# Altium integrated library Weidmueller_OMNIMATE_Power.IntLib: 508 symbols (part 9 of 9)
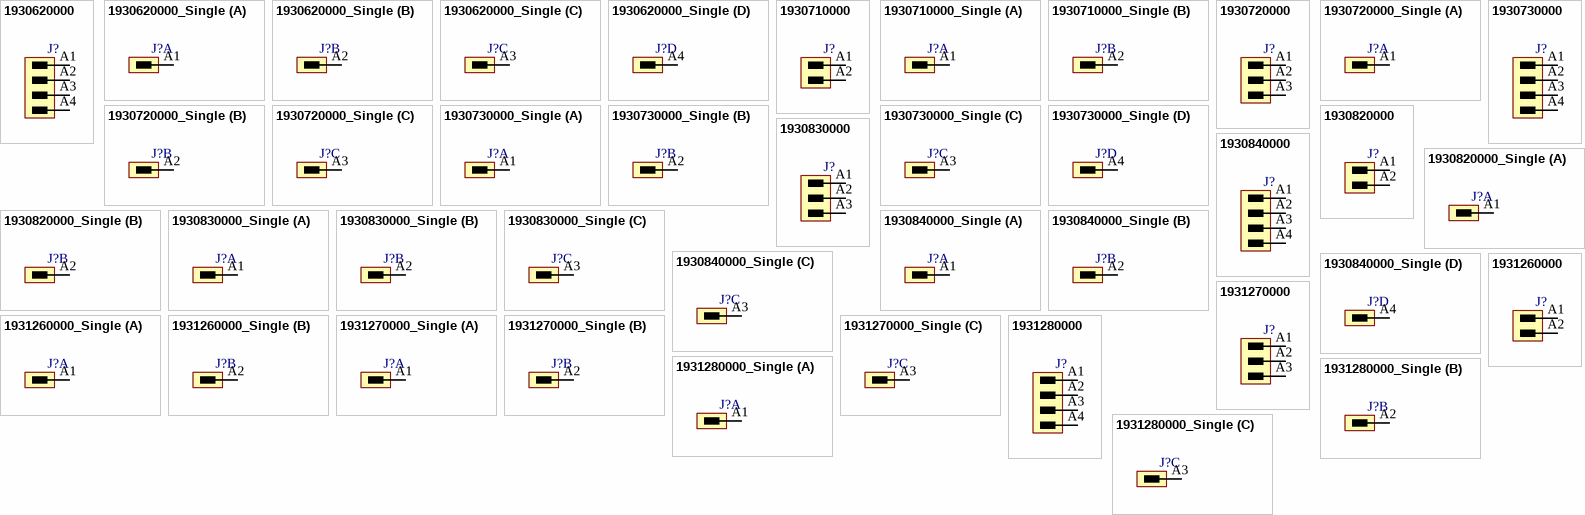
[diagram p39: symbols 1930620000 to 1931280000_Single]

## 1931260000_Single
designator J?
OMNIMATE Power - series BV/SV 7.62HP; PartNumber: 1931260000; Manufacturer: Weidmueller; Short_text_for_material: SV 7.62HP/02/270G 3.5SN BK BX; Side_termination_characteristic: closed side; Mounting_onto_the_PCB: Solder connection; Pitch_mm: 7.62 mm; Pitch_inch: 0.3 inch; No_of_poles: 2; Outgoing_elbow: 270°; Solder_pin_length_mm: 3.5 mm; Contact_material: Cu-Leg; Contact_surface: tinned; Insulating_material: PA GF; UL_94_flammability_rating: V-0; Rated_voltage_for_surge_voltage_class_pollution_degree_II_2: 1000 V; Rated_voltage_use_group_B_UL_1059: 300 V; Rated_current_use_group_B_UL_1059: 40.5 A; PackageReference: SV_7_62HP_270G_02; Colour: Black; Packaging: Box; Qty: 120 PCS; Revision: V1; ComponentLink1Description: Manufacturer URL; ComponentLink1URL: http://www.weidmueller.com/; ComponentLink2Description: URL Link1; ComponentLink2URL: http://catalog.weidmueller.com/catalog/Start.do?localeId=en&ObjectID=1931260000
footprint SV_7_62HP_270G_02 (OMNIMATE Power - Serie BV/SV 7.62HP  SV 7.62HP/02/270G 3.5)
part A pins: A1
part B pins: A2

## 1931270000
designator J?
OMNIMATE Power - series BV/SV 7.62HP; PartNumber: 1931270000; Manufacturer: Weidmueller; Short_text_for_material: SV 7.62HP/03/270G 3.5SN BK BX; Side_termination_characteristic: closed side; Mounting_onto_the_PCB: Solder connection; Pitch_mm: 7.62 mm; Pitch_inch: 0.3 inch; No_of_poles: 3; Outgoing_elbow: 270°; Solder_pin_length_mm: 3.5 mm; Contact_material: Cu-Leg; Contact_surface: tinned; Insulating_material: PA GF; UL_94_flammability_rating: V-0; Rated_voltage_for_surge_voltage_class_pollution_degree_II_2: 1000 V; Rated_voltage_use_group_B_UL_1059: 300 V; Rated_current_use_group_B_UL_1059: 40.5 A; PackageReference: SV_7_62HP_270G_03; Colour: Black; Packaging: Box; Qty: 78 PCS; Revision: V1; ComponentLink1Description: Manufacturer URL; ComponentLink1URL: http://www.weidmueller.com/; ComponentLink2Description: URL Link1; ComponentLink2URL: http://catalog.weidmueller.com/catalog/Start.do?localeId=en&ObjectID=1931270000
footprint SV_7_62HP_270G_03 (OMNIMATE Power - Serie BV/SV 7.62HP  SV 7.62HP/03/270G 3.5)
pins: A1, A2, A3

## 1931270000_Single
designator J?
OMNIMATE Power - series BV/SV 7.62HP; PartNumber: 1931270000; Manufacturer: Weidmueller; Short_text_for_material: SV 7.62HP/03/270G 3.5SN BK BX; Side_termination_characteristic: closed side; Mounting_onto_the_PCB: Solder connection; Pitch_mm: 7.62 mm; Pitch_inch: 0.3 inch; No_of_poles: 3; Outgoing_elbow: 270°; Solder_pin_length_mm: 3.5 mm; Contact_material: Cu-Leg; Contact_surface: tinned; Insulating_material: PA GF; UL_94_flammability_rating: V-0; Rated_voltage_for_surge_voltage_class_pollution_degree_II_2: 1000 V; Rated_voltage_use_group_B_UL_1059: 300 V; Rated_current_use_group_B_UL_1059: 40.5 A; PackageReference: SV_7_62HP_270G_03; Colour: Black; Packaging: Box; Qty: 78 PCS; Revision: V1; ComponentLink1Description: Manufacturer URL; ComponentLink1URL: http://www.weidmueller.com/; ComponentLink2Description: URL Link1; ComponentLink2URL: http://catalog.weidmueller.com/catalog/Start.do?localeId=en&ObjectID=1931270000
footprint SV_7_62HP_270G_03 (OMNIMATE Power - Serie BV/SV 7.62HP  SV 7.62HP/03/270G 3.5)
part A pins: A1
part B pins: A2
part C pins: A3

## 1931280000
designator J?
OMNIMATE Power - series BV/SV 7.62HP; PartNumber: 1931280000; Manufacturer: Weidmueller; Short_text_for_material: SV 7.62HP/04/270G 3.5SN BK BX; Side_termination_characteristic: closed side; Mounting_onto_the_PCB: Solder connection; Pitch_mm: 7.62 mm; Pitch_inch: 0.3 inch; No_of_poles: 4; Outgoing_elbow: 270°; Solder_pin_length_mm: 3.5 mm; Contact_material: Cu-Leg; Contact_surface: tinned; Insulating_material: PA GF; UL_94_flammability_rating: V-0; Rated_voltage_for_surge_voltage_class_pollution_degree_II_2: 1000 V; Rated_voltage_use_group_B_UL_1059: 300 V; Rated_current_use_group_B_UL_1059: 40.5 A; PackageReference: SV_7_62HP_270G_04; Colour: Black; Packaging: Box; Qty: 60 PCS; Revision: V1; ComponentLink1Description: Manufacturer URL; ComponentLink1URL: http://www.weidmueller.com/; ComponentLink2Description: URL Link1; ComponentLink2URL: http://catalog.weidmueller.com/catalog/Start.do?localeId=en&ObjectID=1931280000
footprint SV_7_62HP_270G_04 (OMNIMATE Power - Serie BV/SV 7.62HP  SV 7.62HP/04/270G 3.5)
pins: A1, A2, A3, A4

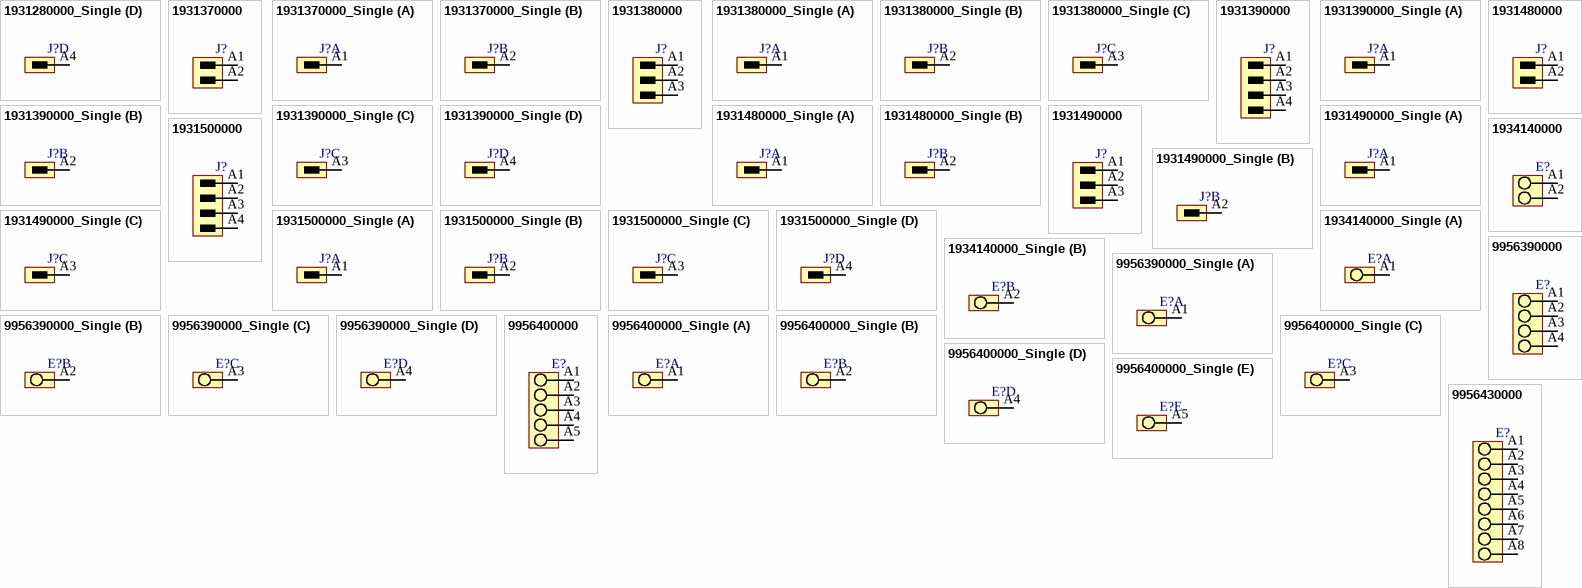
[diagram p30: symbols 1931280000_Single to 9956430000]

## 1931280000_Single
designator J?
OMNIMATE Power - series BV/SV 7.62HP; PartNumber: 1931280000; Manufacturer: Weidmueller; Short_text_for_material: SV 7.62HP/04/270G 3.5SN BK BX; Side_termination_characteristic: closed side; Mounting_onto_the_PCB: Solder connection; Pitch_mm: 7.62 mm; Pitch_inch: 0.3 inch; No_of_poles: 4; Outgoing_elbow: 270°; Solder_pin_length_mm: 3.5 mm; Contact_material: Cu-Leg; Contact_surface: tinned; Insulating_material: PA GF; UL_94_flammability_rating: V-0; Rated_voltage_for_surge_voltage_class_pollution_degree_II_2: 1000 V; Rated_voltage_use_group_B_UL_1059: 300 V; Rated_current_use_group_B_UL_1059: 40.5 A; PackageReference: SV_7_62HP_270G_04; Colour: Black; Packaging: Box; Qty: 60 PCS; Revision: V1; ComponentLink1Description: Manufacturer URL; ComponentLink1URL: http://www.weidmueller.com/; ComponentLink2Description: URL Link1; ComponentLink2URL: http://catalog.weidmueller.com/catalog/Start.do?localeId=en&ObjectID=1931280000
footprint SV_7_62HP_270G_04 (OMNIMATE Power - Serie BV/SV 7.62HP  SV 7.62HP/04/270G 3.5)
part A pins: A1
part B pins: A2
part C pins: A3
part D pins: A4

## 1931370000
designator J?
OMNIMATE Power - series BV/SV 7.62HP; PartNumber: 1931370000; Manufacturer: Weidmueller; Short_text_for_material: SV 7.62HP/02/270F 3.5SN BK BX; Side_termination_characteristic: Clip-on flange; Mounting_onto_the_PCB: Solder connection; Pitch_mm: 7.62 mm; Pitch_inch: 0.3 inch; No_of_poles: 2; Outgoing_elbow: 270°; Solder_pin_length_mm: 3.5 mm; Contact_material: Cu-Leg; Contact_surface: tinned; Insulating_material: PA GF; UL_94_flammability_rating: V-0; Rated_voltage_for_surge_voltage_class_pollution_degree_II_2: 1000 V; Rated_voltage_use_group_B_UL_1059: 300 V; Rated_current_use_group_B_UL_1059: 40.5 A; PackageReference: SV_7_62HP_270F_02; Colour: Black; Packaging: Box; Qty: 60 PCS; Revision: V1; ComponentLink1Description: Manufacturer URL; ComponentLink1URL: http://www.weidmueller.com/; ComponentLink2Description: URL Link1; ComponentLink2URL: http://catalog.weidmueller.com/catalog/Start.do?localeId=en&ObjectID=1931370000
footprint SV_7_62HP_270F_02 (OMNIMATE Power - Serie BV/SV 7.62HP  SV 7.62HP/02/270F 3.5)
pins: A1, A2

## 1931370000_Single
designator J?
OMNIMATE Power - series BV/SV 7.62HP; PartNumber: 1931370000; Manufacturer: Weidmueller; Short_text_for_material: SV 7.62HP/02/270F 3.5SN BK BX; Side_termination_characteristic: Clip-on flange; Mounting_onto_the_PCB: Solder connection; Pitch_mm: 7.62 mm; Pitch_inch: 0.3 inch; No_of_poles: 2; Outgoing_elbow: 270°; Solder_pin_length_mm: 3.5 mm; Contact_material: Cu-Leg; Contact_surface: tinned; Insulating_material: PA GF; UL_94_flammability_rating: V-0; Rated_voltage_for_surge_voltage_class_pollution_degree_II_2: 1000 V; Rated_voltage_use_group_B_UL_1059: 300 V; Rated_current_use_group_B_UL_1059: 40.5 A; PackageReference: SV_7_62HP_270F_02; Colour: Black; Packaging: Box; Qty: 60 PCS; Revision: V1; ComponentLink1Description: Manufacturer URL; ComponentLink1URL: http://www.weidmueller.com/; ComponentLink2Description: URL Link1; ComponentLink2URL: http://catalog.weidmueller.com/catalog/Start.do?localeId=en&ObjectID=1931370000
footprint SV_7_62HP_270F_02 (OMNIMATE Power - Serie BV/SV 7.62HP  SV 7.62HP/02/270F 3.5)
part A pins: A1
part B pins: A2

## 1931380000
designator J?
OMNIMATE Power - series BV/SV 7.62HP; PartNumber: 1931380000; Manufacturer: Weidmueller; Short_text_for_material: SV 7.62HP/03/270F 3.5SN BK BX; Side_termination_characteristic: Clip-on flange; Mounting_onto_the_PCB: Solder connection; Pitch_mm: 7.62 mm; Pitch_inch: 0.3 inch; No_of_poles: 3; Outgoing_elbow: 270°; Solder_pin_length_mm: 3.5 mm; Contact_material: Cu-Leg; Contact_surface: tinned; Insulating_material: PA GF; UL_94_flammability_rating: V-0; Rated_voltage_for_surge_voltage_class_pollution_degree_II_2: 1000 V; Rated_voltage_use_group_B_UL_1059: 300 V; Rated_current_use_group_B_UL_1059: 40.5 A; PackageReference: SV_7_62HP_270F_03; Colour: Black; Packaging: Box; Qty: 48 PCS; Revision: V1; ComponentLink1Description: Manufacturer URL; ComponentLink1URL: http://www.weidmueller.com/; ComponentLink2Description: URL Link1; ComponentLink2URL: http://catalog.weidmueller.com/catalog/Start.do?localeId=en&ObjectID=1931380000
footprint SV_7_62HP_270F_03 (OMNIMATE Power - Serie BV/SV 7.62HP  SV 7.62HP/03/270F 3.5)
pins: A1, A2, A3

## 1931380000_Single
designator J?
OMNIMATE Power - series BV/SV 7.62HP; PartNumber: 1931380000; Manufacturer: Weidmueller; Short_text_for_material: SV 7.62HP/03/270F 3.5SN BK BX; Side_termination_characteristic: Clip-on flange; Mounting_onto_the_PCB: Solder connection; Pitch_mm: 7.62 mm; Pitch_inch: 0.3 inch; No_of_poles: 3; Outgoing_elbow: 270°; Solder_pin_length_mm: 3.5 mm; Contact_material: Cu-Leg; Contact_surface: tinned; Insulating_material: PA GF; UL_94_flammability_rating: V-0; Rated_voltage_for_surge_voltage_class_pollution_degree_II_2: 1000 V; Rated_voltage_use_group_B_UL_1059: 300 V; Rated_current_use_group_B_UL_1059: 40.5 A; PackageReference: SV_7_62HP_270F_03; Colour: Black; Packaging: Box; Qty: 48 PCS; Revision: V1; ComponentLink1Description: Manufacturer URL; ComponentLink1URL: http://www.weidmueller.com/; ComponentLink2Description: URL Link1; ComponentLink2URL: http://catalog.weidmueller.com/catalog/Start.do?localeId=en&ObjectID=1931380000
footprint SV_7_62HP_270F_03 (OMNIMATE Power - Serie BV/SV 7.62HP  SV 7.62HP/03/270F 3.5)
part A pins: A1
part B pins: A2
part C pins: A3

## 1931390000
designator J?
OMNIMATE Power - series BV/SV 7.62HP; PartNumber: 1931390000; Manufacturer: Weidmueller; Short_text_for_material: SV 7.62HP/04/270F 3.5SN BK BX; Side_termination_characteristic: Clip-on flange; Mounting_onto_the_PCB: Solder connection; Pitch_mm: 7.62 mm; Pitch_inch: 0.3 inch; No_of_poles: 4; Outgoing_elbow: 270°; Solder_pin_length_mm: 3.5 mm; Contact_material: Cu-Leg; Contact_surface: tinned; Insulating_material: PA GF; UL_94_flammability_rating: V-0; Rated_voltage_for_surge_voltage_class_pollution_degree_II_2: 1000 V; Rated_voltage_use_group_B_UL_1059: 300 V; Rated_current_use_group_B_UL_1059: 40.5 A; PackageReference: SV_7_62HP_270F_04; Colour: Black; Packaging: Box; Qty: 36 PCS; Revision: V1; ComponentLink1Description: Manufacturer URL; ComponentLink1URL: http://www.weidmueller.com/; ComponentLink2Description: URL Link1; ComponentLink2URL: http://catalog.weidmueller.com/catalog/Start.do?localeId=en&ObjectID=1931390000
footprint SV_7_62HP_270F_04 (OMNIMATE Power - Serie BV/SV 7.62HP  SV 7.62HP/04/270F 3.5)
pins: A1, A2, A3, A4

## 1931390000_Single
designator J?
OMNIMATE Power - series BV/SV 7.62HP; PartNumber: 1931390000; Manufacturer: Weidmueller; Short_text_for_material: SV 7.62HP/04/270F 3.5SN BK BX; Side_termination_characteristic: Clip-on flange; Mounting_onto_the_PCB: Solder connection; Pitch_mm: 7.62 mm; Pitch_inch: 0.3 inch; No_of_poles: 4; Outgoing_elbow: 270°; Solder_pin_length_mm: 3.5 mm; Contact_material: Cu-Leg; Contact_surface: tinned; Insulating_material: PA GF; UL_94_flammability_rating: V-0; Rated_voltage_for_surge_voltage_class_pollution_degree_II_2: 1000 V; Rated_voltage_use_group_B_UL_1059: 300 V; Rated_current_use_group_B_UL_1059: 40.5 A; PackageReference: SV_7_62HP_270F_04; Colour: Black; Packaging: Box; Qty: 36 PCS; Revision: V1; ComponentLink1Description: Manufacturer URL; ComponentLink1URL: http://www.weidmueller.com/; ComponentLink2Description: URL Link1; ComponentLink2URL: http://catalog.weidmueller.com/catalog/Start.do?localeId=en&ObjectID=1931390000
footprint SV_7_62HP_270F_04 (OMNIMATE Power - Serie BV/SV 7.62HP  SV 7.62HP/04/270F 3.5)
part A pins: A1
part B pins: A2
part C pins: A3
part D pins: A4

## 1931480000
designator J?
OMNIMATE Power - series BV/SV 7.62HP; PartNumber: 1931480000; Manufacturer: Weidmueller; Short_text_for_material: SV 7.62HP/02/270SF 3.5SN BK BX; Side_termination_characteristic: Screw/clip-on flange; Mounting_onto_the_PCB: Solder connection; Pitch_mm: 7.62 mm; Pitch_inch: 0.3 inch; No_of_poles: 2; Outgoing_elbow: 270°; Solder_pin_length_mm: 3.5 mm; Contact_material: Cu-Leg; Contact_surface: tinned; Insulating_material: PA GF; UL_94_flammability_rating: V-0; Rated_voltage_for_surge_voltage_class_pollution_degree_II_2: 1000 V; Rated_voltage_use_group_B_UL_1059: 300 V; Rated_current_use_group_B_UL_1059: 40.5 A; PackageReference: SV_7_62HP_270SF_02; Colour: Black; Packaging: Box; Qty: 100 PCS; Revision: V1; ComponentLink1Description: Manufacturer URL; ComponentLink1URL: http://www.weidmueller.com/; ComponentLink2Description: URL Link1; ComponentLink2URL: http://catalog.weidmueller.com/catalog/Start.do?localeId=en&ObjectID=1931480000
footprint SV_7_62HP_270SF_02 (OMNIMATE Power - Serie BV/SV 7.62HP  SV 7.62HP/02/270SF 3.5)
pins: A1, A2

## 1931480000_Single
designator J?
OMNIMATE Power - series BV/SV 7.62HP; PartNumber: 1931480000; Manufacturer: Weidmueller; Short_text_for_material: SV 7.62HP/02/270SF 3.5SN BK BX; Side_termination_characteristic: Screw/clip-on flange; Mounting_onto_the_PCB: Solder connection; Pitch_mm: 7.62 mm; Pitch_inch: 0.3 inch; No_of_poles: 2; Outgoing_elbow: 270°; Solder_pin_length_mm: 3.5 mm; Contact_material: Cu-Leg; Contact_surface: tinned; Insulating_material: PA GF; UL_94_flammability_rating: V-0; Rated_voltage_for_surge_voltage_class_pollution_degree_II_2: 1000 V; Rated_voltage_use_group_B_UL_1059: 300 V; Rated_current_use_group_B_UL_1059: 40.5 A; PackageReference: SV_7_62HP_270SF_02; Colour: Black; Packaging: Box; Qty: 100 PCS; Revision: V1; ComponentLink1Description: Manufacturer URL; ComponentLink1URL: http://www.weidmueller.com/; ComponentLink2Description: URL Link1; ComponentLink2URL: http://catalog.weidmueller.com/catalog/Start.do?localeId=en&ObjectID=1931480000
footprint SV_7_62HP_270SF_02 (OMNIMATE Power - Serie BV/SV 7.62HP  SV 7.62HP/02/270SF 3.5)
part A pins: A1
part B pins: A2

## 1931490000
designator J?
OMNIMATE Power - series BV/SV 7.62HP; PartNumber: 1931490000; Manufacturer: Weidmueller; Short_text_for_material: SV 7.62HP/03/270SF 3.5SN BK BX; Side_termination_characteristic: Screw/clip-on flange; Mounting_onto_the_PCB: Solder connection; Pitch_mm: 7.62 mm; Pitch_inch: 0.3 inch; No_of_poles: 3; Outgoing_elbow: 270°; Solder_pin_length_mm: 3.5 mm; Contact_material: Cu-Leg; Contact_surface: tinned; Insulating_material: PA GF; UL_94_flammability_rating: V-0; Rated_voltage_for_surge_voltage_class_pollution_degree_II_2: 1000 V; Rated_voltage_use_group_B_UL_1059: 300 V; Rated_current_use_group_B_UL_1059: 40.5 A; PackageReference: SV_7_62HP_270SF_03; Colour: Black; Packaging: Box; Qty: 100 PCS; Revision: V1; ComponentLink1Description: Manufacturer URL; ComponentLink1URL: http://www.weidmueller.com/; ComponentLink2Description: URL Link1; ComponentLink2URL: http://catalog.weidmueller.com/catalog/Start.do?localeId=en&ObjectID=1931490000
footprint SV_7_62HP_270SF_03 (OMNIMATE Power - Serie BV/SV 7.62HP  SV 7.62HP/03/270SF 3.5)
pins: A1, A2, A3

## 1931490000_Single
designator J?
OMNIMATE Power - series BV/SV 7.62HP; PartNumber: 1931490000; Manufacturer: Weidmueller; Short_text_for_material: SV 7.62HP/03/270SF 3.5SN BK BX; Side_termination_characteristic: Screw/clip-on flange; Mounting_onto_the_PCB: Solder connection; Pitch_mm: 7.62 mm; Pitch_inch: 0.3 inch; No_of_poles: 3; Outgoing_elbow: 270°; Solder_pin_length_mm: 3.5 mm; Contact_material: Cu-Leg; Contact_surface: tinned; Insulating_material: PA GF; UL_94_flammability_rating: V-0; Rated_voltage_for_surge_voltage_class_pollution_degree_II_2: 1000 V; Rated_voltage_use_group_B_UL_1059: 300 V; Rated_current_use_group_B_UL_1059: 40.5 A; PackageReference: SV_7_62HP_270SF_03; Colour: Black; Packaging: Box; Qty: 100 PCS; Revision: V1; ComponentLink1Description: Manufacturer URL; ComponentLink1URL: http://www.weidmueller.com/; ComponentLink2Description: URL Link1; ComponentLink2URL: http://catalog.weidmueller.com/catalog/Start.do?localeId=en&ObjectID=1931490000
footprint SV_7_62HP_270SF_03 (OMNIMATE Power - Serie BV/SV 7.62HP  SV 7.62HP/03/270SF 3.5)
part A pins: A1
part B pins: A2
part C pins: A3

## 1931500000
designator J?
OMNIMATE Power - series BV/SV 7.62HP; PartNumber: 1931500000; Manufacturer: Weidmueller; Short_text_for_material: SV 7.62HP/04/270SF 3.5SN BK BX; Side_termination_characteristic: Screw/clip-on flange; Mounting_onto_the_PCB: Solder connection; Pitch_mm: 7.62 mm; Pitch_inch: 0.3 inch; No_of_poles: 4; Outgoing_elbow: 270°; Solder_pin_length_mm: 3.5 mm; Contact_material: Cu-Leg; Contact_surface: tinned; Insulating_material: PA GF; UL_94_flammability_rating: V-0; Rated_voltage_for_surge_voltage_class_pollution_degree_II_2: 1000 V; Rated_voltage_use_group_B_UL_1059: 300 V; Rated_current_use_group_B_UL_1059: 40.5 A; PackageReference: SV_7_62HP_270SF_04; Colour: Black; Packaging: Box; Qty: 100 PCS; Revision: V1; ComponentLink1Description: Manufacturer URL; ComponentLink1URL: http://www.weidmueller.com/; ComponentLink2Description: URL Link1; ComponentLink2URL: http://catalog.weidmueller.com/catalog/Start.do?localeId=en&ObjectID=1931500000
footprint SV_7_62HP_270SF_04 (OMNIMATE Power - Serie BV/SV 7.62HP  SV 7.62HP/04/270SF 3.5)
pins: A1, A2, A3, A4

## 1931500000_Single
designator J?
OMNIMATE Power - series BV/SV 7.62HP; PartNumber: 1931500000; Manufacturer: Weidmueller; Short_text_for_material: SV 7.62HP/04/270SF 3.5SN BK BX; Side_termination_characteristic: Screw/clip-on flange; Mounting_onto_the_PCB: Solder connection; Pitch_mm: 7.62 mm; Pitch_inch: 0.3 inch; No_of_poles: 4; Outgoing_elbow: 270°; Solder_pin_length_mm: 3.5 mm; Contact_material: Cu-Leg; Contact_surface: tinned; Insulating_material: PA GF; UL_94_flammability_rating: V-0; Rated_voltage_for_surge_voltage_class_pollution_degree_II_2: 1000 V; Rated_voltage_use_group_B_UL_1059: 300 V; Rated_current_use_group_B_UL_1059: 40.5 A; PackageReference: SV_7_62HP_270SF_04; Colour: Black; Packaging: Box; Qty: 100 PCS; Revision: V1; ComponentLink1Description: Manufacturer URL; ComponentLink1URL: http://www.weidmueller.com/; ComponentLink2Description: URL Link1; ComponentLink2URL: http://catalog.weidmueller.com/catalog/Start.do?localeId=en&ObjectID=1931500000
footprint SV_7_62HP_270SF_04 (OMNIMATE Power - Serie BV/SV 7.62HP  SV 7.62HP/04/270SF 3.5)
part A pins: A1
part B pins: A2
part C pins: A3
part D pins: A4

## 1934140000
designator E?
OMNIMATE Power - series LU; PartNumber: 1934140000; Manufacturer: Weidmueller; Short_text_for_material: LU 10.16/02/90 4.5SN BK BX; Side_termination_characteristic: closed side; Mounting_onto_the_PCB: Solder connection; Pitch_mm: 10,16 mm; Pitch_inch: 0,4 inch; No_of_poles: 2; Solder_pin_length_mm: 4,5 mm; Contact_material: E-Cu; Contact_surface: tinned; Insulating_material: Wemid (PA); UL_94_flammability_rating: V-0; Rated_voltage_for_surge_voltage_class_pollution_degree_II_2: 1000 V; Solid_min_H05_07_V_U: 0,5 mm²; Solid_max_H05_07_V_U: 16 mm²; Rated_voltage_use_group_B_UL_1059: 300 V; Rated_current_use_group_B_UL_1059: 65 A; Wire_cross_section_AWG_min_UL_1059: AWG 26; Wire_cross_section_AWG_max_UL_1059: AWG 6; PackageReference: LU_10_16_90_02; Colour: Black; Packaging: Box; Qty: 20 PCS; Revision: V1; ComponentLink1Description: Manufacturer URL; ComponentLink1URL: http://www.weidmueller.com/; ComponentLink2Description: URL Link1; ComponentLink2URL: http://catalog.weidmueller.com/catalog/Start.do?localeId=en&ObjectID=1934140000
footprint LU_10_16_90_02 (OMNIMATE Power - Serie LU  LU 10.16/02/90 4.5)
pins: A1, A2
1 alternate drawing of the same symbol

## 1934140000_Single
designator E?
OMNIMATE Power - series LU; PartNumber: 1934140000; Manufacturer: Weidmueller; Short_text_for_material: LU 10.16/02/90 4.5SN BK BX; Side_termination_characteristic: closed side; Mounting_onto_the_PCB: Solder connection; Pitch_mm: 10,16 mm; Pitch_inch: 0,4 inch; No_of_poles: 2; Solder_pin_length_mm: 4,5 mm; Contact_material: E-Cu; Contact_surface: tinned; Insulating_material: Wemid (PA); UL_94_flammability_rating: V-0; Rated_voltage_for_surge_voltage_class_pollution_degree_II_2: 1000 V; Solid_min_H05_07_V_U: 0,5 mm²; Solid_max_H05_07_V_U: 16 mm²; Rated_voltage_use_group_B_UL_1059: 300 V; Rated_current_use_group_B_UL_1059: 65 A; Wire_cross_section_AWG_min_UL_1059: AWG 26; Wire_cross_section_AWG_max_UL_1059: AWG 6; PackageReference: LU_10_16_90_02; Colour: Black; Packaging: Box; Qty: 20 PCS; Revision: V1; ComponentLink1Description: Manufacturer URL; ComponentLink1URL: http://www.weidmueller.com/; ComponentLink2Description: URL Link1; ComponentLink2URL: http://catalog.weidmueller.com/catalog/Start.do?localeId=en&ObjectID=1934140000
footprint LU_10_16_90_02 (OMNIMATE Power - Serie LU  LU 10.16/02/90 4.5)
part A pins: A1
part B pins: A2
1 alternate drawing of the same symbol

## 9956390000
designator E?
OMNIMATE Power - series LU; PartNumber: 9956390000; Manufacturer: Weidmueller; Short_text_for_material: LU 10.16/04/90 4.5SN GY BX; Side_termination_characteristic: closed side; Mounting_onto_the_PCB: Solder connection; Pitch_mm: 10,16 mm; Pitch_inch: 0,4 inch; No_of_poles: 4; Solder_pin_length_mm: 4,5 mm; Contact_material: E-Cu; Contact_surface: tinned; Insulating_material: Wemid (PA); UL_94_flammability_rating: V-0; Rated_voltage_for_surge_voltage_class_pollution_degree_II_2: 1000 V; Rated_current_min_no_of_poles_TU_20_deg_C: 76 A; Solid_min_H05_07_V_U: 0,5 mm²; Solid_max_H05_07_V_U: 16 mm²; Rated_voltage_use_group_B_UL_1059: 300 V; Rated_current_use_group_B_UL_1059: 65 A; Wire_cross_section_AWG_min_UL_1059: AWG 26; Wire_cross_section_AWG_max_UL_1059: AWG 6; PackageReference: LU_10_16_90_04; Colour: Pebble grey; Packaging: Box; Qty: 20 PCS; Revision: V1; ComponentLink1Description: Manufacturer URL; ComponentLink1URL: http://www.weidmueller.com/; ComponentLink2Description: URL Link1; ComponentLink2URL: http://catalog.weidmueller.com/catalog/Start.do?localeId=en&ObjectID=9956390000
footprint LU_10_16_90_04 (OMNIMATE Power - Serie LU  LU 10.16/04/90 4.5)
pins: A1, A2, A3, A4
1 alternate drawing of the same symbol

## 9956390000_Single
designator E?
OMNIMATE Power - series LU; PartNumber: 9956390000; Manufacturer: Weidmueller; Short_text_for_material: LU 10.16/04/90 4.5SN GY BX; Side_termination_characteristic: closed side; Mounting_onto_the_PCB: Solder connection; Pitch_mm: 10,16 mm; Pitch_inch: 0,4 inch; No_of_poles: 4; Solder_pin_length_mm: 4,5 mm; Contact_material: E-Cu; Contact_surface: tinned; Insulating_material: Wemid (PA); UL_94_flammability_rating: V-0; Rated_voltage_for_surge_voltage_class_pollution_degree_II_2: 1000 V; Rated_current_min_no_of_poles_TU_20_deg_C: 76 A; Solid_min_H05_07_V_U: 0,5 mm²; Solid_max_H05_07_V_U: 16 mm²; Rated_voltage_use_group_B_UL_1059: 300 V; Rated_current_use_group_B_UL_1059: 65 A; Wire_cross_section_AWG_min_UL_1059: AWG 26; Wire_cross_section_AWG_max_UL_1059: AWG 6; PackageReference: LU_10_16_90_04; Colour: Pebble grey; Packaging: Box; Qty: 20 PCS; Revision: V1; ComponentLink1Description: Manufacturer URL; ComponentLink1URL: http://www.weidmueller.com/; ComponentLink2Description: URL Link1; ComponentLink2URL: http://catalog.weidmueller.com/catalog/Start.do?localeId=en&ObjectID=9956390000
footprint LU_10_16_90_04 (OMNIMATE Power - Serie LU  LU 10.16/04/90 4.5)
part A pins: A1
part B pins: A2
part C pins: A3
part D pins: A4
1 alternate drawing of the same symbol

## 9956400000
designator E?
OMNIMATE Power - series LU; PartNumber: 9956400000; Manufacturer: Weidmueller; Short_text_for_material: LU 10.16/05/90 4.5SN GY BX; Side_termination_characteristic: closed side; Mounting_onto_the_PCB: Solder connection; Pitch_mm: 10,16 mm; Pitch_inch: 0,4 inch; No_of_poles: 5; Solder_pin_length_mm: 4,5 mm; Contact_material: E-Cu; Contact_surface: tinned; Insulating_material: Wemid (PA); UL_94_flammability_rating: V-0; Rated_voltage_for_surge_voltage_class_pollution_degree_II_2: 1000 V; Rated_current_min_no_of_poles_TU_20_deg_C: 76 A; Solid_min_H05_07_V_U: 0,5 mm²; Solid_max_H05_07_V_U: 16 mm²; Rated_voltage_use_group_B_UL_1059: 300 V; Rated_current_use_group_B_UL_1059: 65 A; Wire_cross_section_AWG_min_UL_1059: AWG 26; Wire_cross_section_AWG_max_UL_1059: AWG 6; PackageReference: LU_10_16_90_05; Colour: Pebble grey; Packaging: Box; Qty: 20 PCS; Revision: V1; ComponentLink1Description: Manufacturer URL; ComponentLink1URL: http://www.weidmueller.com/; ComponentLink2Description: URL Link1; ComponentLink2URL: http://catalog.weidmueller.com/catalog/Start.do?localeId=en&ObjectID=9956400000
footprint LU_10_16_90_05 (OMNIMATE Power - Serie LU  LU 10.16/05/90 4.5)
pins: A1, A2, A3, A4, A5
1 alternate drawing of the same symbol

## 9956400000_Single
designator E?
OMNIMATE Power - series LU; PartNumber: 9956400000; Manufacturer: Weidmueller; Short_text_for_material: LU 10.16/05/90 4.5SN GY BX; Side_termination_characteristic: closed side; Mounting_onto_the_PCB: Solder connection; Pitch_mm: 10,16 mm; Pitch_inch: 0,4 inch; No_of_poles: 5; Solder_pin_length_mm: 4,5 mm; Contact_material: E-Cu; Contact_surface: tinned; Insulating_material: Wemid (PA); UL_94_flammability_rating: V-0; Rated_voltage_for_surge_voltage_class_pollution_degree_II_2: 1000 V; Rated_current_min_no_of_poles_TU_20_deg_C: 76 A; Solid_min_H05_07_V_U: 0,5 mm²; Solid_max_H05_07_V_U: 16 mm²; Rated_voltage_use_group_B_UL_1059: 300 V; Rated_current_use_group_B_UL_1059: 65 A; Wire_cross_section_AWG_min_UL_1059: AWG 26; Wire_cross_section_AWG_max_UL_1059: AWG 6; PackageReference: LU_10_16_90_05; Colour: Pebble grey; Packaging: Box; Qty: 20 PCS; Revision: V1; ComponentLink1Description: Manufacturer URL; ComponentLink1URL: http://www.weidmueller.com/; ComponentLink2Description: URL Link1; ComponentLink2URL: http://catalog.weidmueller.com/catalog/Start.do?localeId=en&ObjectID=9956400000
footprint LU_10_16_90_05 (OMNIMATE Power - Serie LU  LU 10.16/05/90 4.5)
part A pins: A1
part B pins: A2
part C pins: A3
part D pins: A4
part E pins: A5
1 alternate drawing of the same symbol

## 9956430000
designator E?
OMNIMATE Power - series LU; PartNumber: 9956430000; Manufacturer: Weidmueller; Short_text_for_material: LU 10.16/08/90 4.5SN GY BX; Side_termination_characteristic: closed side; Mounting_onto_the_PCB: Solder connection; Pitch_mm: 10,16 mm; Pitch_inch: 0,4 inch; No_of_poles: 8; Solder_pin_length_mm: 4,5 mm; Contact_material: E-Cu; Contact_surface: tinned; Insulating_material: Wemid (PA); UL_94_flammability_rating: V-0; Rated_voltage_for_surge_voltage_class_pollution_degree_II_2: 1000 V; Rated_current_min_no_of_poles_TU_20_deg_C: 76 A; Solid_min_H05_07_V_U: 0,5 mm²; Solid_max_H05_07_V_U: 16 mm²; Rated_voltage_use_group_B_UL_1059: 300 V; Rated_current_use_group_B_UL_1059: 65 A; Wire_cross_section_AWG_min_UL_1059: AWG 26; Wire_cross_section_AWG_max_UL_1059: AWG 6; PackageReference: LU_10_16_90_08; Colour: Pebble grey; Packaging: Box; Qty: 20 PCS; Revision: V1; ComponentLink1Description: Manufacturer URL; ComponentLink1URL: http://www.weidmueller.com/; ComponentLink2Description: URL Link1; ComponentLink2URL: http://catalog.weidmueller.com/catalog/Start.do?localeId=en&ObjectID=9956430000
footprint LU_10_16_90_08 (OMNIMATE Power - Serie LU  LU 10.16/08/90 4.5)
pins: A1, A2, A3, A4, A5, A6, A7, A8
1 alternate drawing of the same symbol

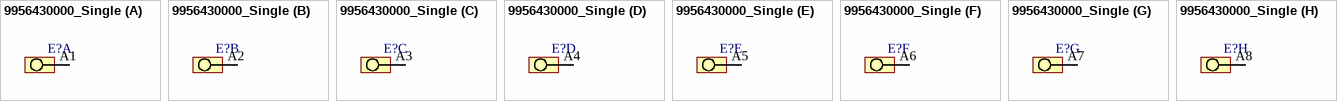
[diagram p31: symbol 9956430000_Single]

## 9956430000_Single
designator E?
OMNIMATE Power - series LU; PartNumber: 9956430000; Manufacturer: Weidmueller; Short_text_for_material: LU 10.16/08/90 4.5SN GY BX; Side_termination_characteristic: closed side; Mounting_onto_the_PCB: Solder connection; Pitch_mm: 10,16 mm; Pitch_inch: 0,4 inch; No_of_poles: 8; Solder_pin_length_mm: 4,5 mm; Contact_material: E-Cu; Contact_surface: tinned; Insulating_material: Wemid (PA); UL_94_flammability_rating: V-0; Rated_voltage_for_surge_voltage_class_pollution_degree_II_2: 1000 V; Rated_current_min_no_of_poles_TU_20_deg_C: 76 A; Solid_min_H05_07_V_U: 0,5 mm²; Solid_max_H05_07_V_U: 16 mm²; Rated_voltage_use_group_B_UL_1059: 300 V; Rated_current_use_group_B_UL_1059: 65 A; Wire_cross_section_AWG_min_UL_1059: AWG 26; Wire_cross_section_AWG_max_UL_1059: AWG 6; PackageReference: LU_10_16_90_08; Colour: Pebble grey; Packaging: Box; Qty: 20 PCS; Revision: V1; ComponentLink1Description: Manufacturer URL; ComponentLink1URL: http://www.weidmueller.com/; ComponentLink2Description: URL Link1; ComponentLink2URL: http://catalog.weidmueller.com/catalog/Start.do?localeId=en&ObjectID=9956430000
footprint LU_10_16_90_08 (OMNIMATE Power - Serie LU  LU 10.16/08/90 4.5)
part A pins: A1
part B pins: A2
part C pins: A3
part D pins: A4
part E pins: A5
part F pins: A6
part G pins: A7
part H pins: A8
1 alternate drawing of the same symbol